# Altium schematic symbol library jlcpcb_2025_04_capacitors_extended_0805.schlib: 3281 symbols (part 16 of 18) (continued)
## JMK212BJ106MG-T (continued)
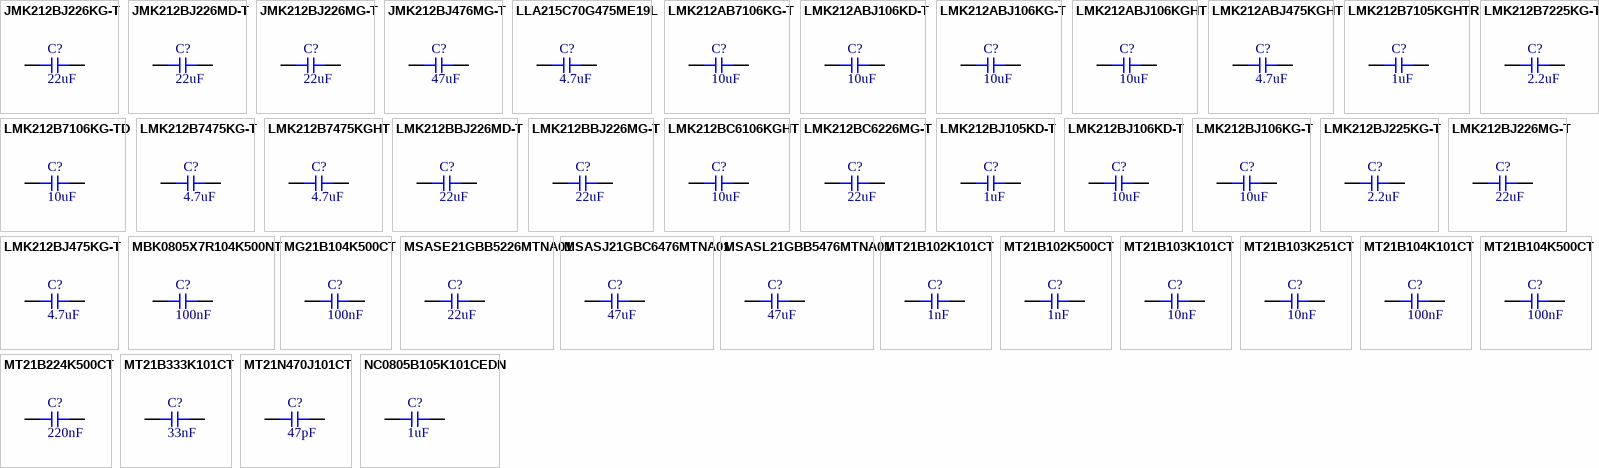
[diagram p71: symbols JMK212BJ226KG-T to NC0805B105K101CEDN]

## JMK212BJ226KG-T
designator C?  Capacitance: 22uF  (hidden comment: *)
Capacitor, Ceramic (MLCC), 22uF, ±10%, 6.3V, X5R, ±10%, SMD 0805; Manufacturer: Taiyo Yuden; Manufacturer Part Number: JMK212BJ226KG-T; Package Size: 0805; JLCPCB Basic Part: No; JLCPCB Part Number: C337450; Supplier 1: LCSC; Category: Capacitors - MLCC; Supplier Part Number 1: C337450; Tolerance: ±10%; Voltage Rating: 6.3V; Temperature Coefficient: X5R; RoHS: Yes; ComponentLink1Description: Datasheet; ComponentLink1URL: https://wmsc.lcsc.com/wmsc/upload/file/pdf/v2/lcsc/2211282230_Taiyo-Yuden-JMK212BJ226KG-T_C337450.pdf; ComponentLink2Description: JLCPCB Part URL; ComponentLink2URL: https://jlcpcb.com/partdetail/C337450; ComponentLink3Description: LCSC Part URL; ComponentLink3URL: https://lcsc.com/product-detail/Multilayer-Ceramic-Capacitors-MLCC---SMD-SMT_Taiyo-Yuden-Taiyo-Yuden-JMK212BJ226KG-T_C337450.html
footprint CAP-0805 (0805 (2012M) Capacitor)
pins: 1, 2

## JMK212BJ226MD-T
designator C?  Capacitance: 22uF  (hidden comment: *)
Capacitor, Ceramic (MLCC), 22uF, ±20%, 6.3V, X5R, ±20%, SMD 0805; Manufacturer: Taiyo Yuden; Manufacturer Part Number: JMK212BJ226MD-T; Package Size: 0805; JLCPCB Basic Part: No; JLCPCB Part Number: C111325; Supplier 1: LCSC; Category: Capacitors - MLCC; Supplier Part Number 1: C111325; Tolerance: ±20%; Voltage Rating: 6.3V; Temperature Coefficient: X5R; RoHS: Yes; ComponentLink1Description: Datasheet; ComponentLink1URL: https://wmsc.lcsc.com/wmsc/upload/file/pdf/v2/lcsc/2211282300_Taiyo-Yuden-JMK212BJ226MD-T_C111325.pdf; ComponentLink2Description: JLCPCB Part URL; ComponentLink2URL: https://jlcpcb.com/partdetail/C111325; ComponentLink3Description: LCSC Part URL; ComponentLink3URL: https://lcsc.com/product-detail/Multilayer-Ceramic-Capacitors-MLCC---SMD-SMT_Taiyo-Yuden-Taiyo-Yuden-JMK212BJ226MD-T_C111325.html
footprint CAP-0805 (0805 (2012M) Capacitor)
pins: 1, 2

## JMK212BJ226MG-T
designator C?  Capacitance: 22uF  (hidden comment: *)
Capacitor, Ceramic (MLCC), 22uF, ±20%, 6.3V, X5R, ±20%, SMD 0805; Manufacturer: Taiyo Yuden; Manufacturer Part Number: JMK212BJ226MG-T; Package Size: 0805; JLCPCB Basic Part: No; JLCPCB Part Number: C87158; Supplier 1: LCSC; Category: Capacitors - MLCC; Supplier Part Number 1: C87158; Tolerance: ±20%; Voltage Rating: 6.3V; Temperature Coefficient: X5R; RoHS: Yes; ComponentLink1Description: Datasheet; ComponentLink1URL: https://wmsc.lcsc.com/wmsc/upload/file/pdf/v2/lcsc/2304140030_Taiyo-Yuden-JMK212BJ226MG-T_C87158.pdf; ComponentLink2Description: JLCPCB Part URL; ComponentLink2URL: https://jlcpcb.com/partdetail/C87158; ComponentLink3Description: LCSC Part URL; ComponentLink3URL: https://lcsc.com/product-detail/Multilayer-Ceramic-Capacitors-MLCC---SMD-SMT_Taiyo-Yuden-Taiyo-Yuden-JMK212BJ226MG-T_C87158.html
footprint CAP-0805 (0805 (2012M) Capacitor)
pins: 1, 2

## JMK212BJ476MG-T
designator C?  Capacitance: 47uF  (hidden comment: *)
Capacitor, Ceramic (MLCC), 47uF, ±20%, 6.3V, X5R, ±20%, SMD 0805; Manufacturer: Taiyo Yuden; Manufacturer Part Number: JMK212BJ476MG-T; Package Size: 0805; JLCPCB Basic Part: No; JLCPCB Part Number: C87159; Supplier 1: LCSC; Category: Capacitors - MLCC; Supplier Part Number 1: C87159; Tolerance: ±20%; Voltage Rating: 6.3V; Temperature Coefficient: X5R; RoHS: Yes; ComponentLink1Description: Datasheet; ComponentLink1URL: https://wmsc.lcsc.com/wmsc/upload/file/pdf/v2/lcsc/2211282300_Taiyo-Yuden-JMK212BJ476MG-T_C87159.pdf; ComponentLink2Description: JLCPCB Part URL; ComponentLink2URL: https://jlcpcb.com/partdetail/C87159; ComponentLink3Description: LCSC Part URL; ComponentLink3URL: https://lcsc.com/product-detail/Multilayer-Ceramic-Capacitors-MLCC---SMD-SMT_Taiyo-Yuden-Taiyo-Yuden-JMK212BJ476MG-T_C87159.html
footprint CAP-0805 (0805 (2012M) Capacitor)
pins: 1, 2

## LLA215C70G475ME19L
designator C?  Capacitance: 4.7uF  (hidden comment: *)
Capacitor, Ceramic (MLCC), 4.7uF, ±20%, 4V, X7S, ±20%, SMD 0805; Manufacturer: Murata Electronics; Manufacturer Part Number: LLA215C70G475ME19L; Package Size: 0805; JLCPCB Basic Part: No; JLCPCB Part Number: C2293316; Supplier 1: LCSC; Category: Capacitors - MLCC; Supplier Part Number 1: C2293316; Tolerance: ±20%; Voltage Rating: 4V; Temperature Coefficient: X7S; RoHS: Yes; ComponentLink1Description: Datasheet; ComponentLink1URL: https://wmsc.lcsc.com/wmsc/upload/file/pdf/v2/lcsc/2308111644_Murata-Electronics-LLA215C70G475ME19L_C2293316.pdf; ComponentLink2Description: JLCPCB Part URL; ComponentLink2URL: https://jlcpcb.com/partdetail/C2293316; ComponentLink3Description: LCSC Part URL; ComponentLink3URL: https://lcsc.com/product-detail/Multilayer-Ceramic-Capacitors-MLCC---SMD-SMT_Murata-Electronics-Murata-Electronics-LLA215C70G475ME19L_C2293316.html
footprint CAP-0805 (0805 (2012M) Capacitor)
pins: 1, 2

## LMK212AB7106KG-T
designator C?  Capacitance: 10uF  (hidden comment: *)
Capacitor, Ceramic (MLCC), 10uF, ±10%, 10V, X7R, ±10%, SMD 0805; Manufacturer: Taiyo Yuden; Manufacturer Part Number: LMK212AB7106KG-T; Package Size: 0805; JLCPCB Basic Part: No; JLCPCB Part Number: C386056; Supplier 1: LCSC; Category: Capacitors - MLCC; Supplier Part Number 1: C386056; Tolerance: ±10%; Voltage Rating: 10V; Temperature Coefficient: X7R; RoHS: Yes; ComponentLink1Description: Datasheet; ComponentLink1URL: https://wmsc.lcsc.com/wmsc/upload/file/pdf/v2/lcsc/2304140030_Taiyo-Yuden-LMK212AB7106KG-T_C386056.pdf; ComponentLink2Description: JLCPCB Part URL; ComponentLink2URL: https://jlcpcb.com/partdetail/C386056; ComponentLink3Description: LCSC Part URL; ComponentLink3URL: https://lcsc.com/product-detail/Multilayer-Ceramic-Capacitors-MLCC---SMD-SMT_Taiyo-Yuden-Taiyo-Yuden-LMK212AB7106KG-T_C386056.html
footprint CAP-0805 (0805 (2012M) Capacitor)
pins: 1, 2

## LMK212ABJ106KD-T
designator C?  Capacitance: 10uF  (hidden comment: *)
Capacitor, Ceramic (MLCC), 10uF, ±10%, 10V, X5R, ±10%, SMD 0805; Manufacturer: Taiyo Yuden; Manufacturer Part Number: LMK212ABJ106KD-T; Package Size: 0805; JLCPCB Basic Part: No; JLCPCB Part Number: C2174247; Supplier 1: LCSC; Category: Capacitors - MLCC; Supplier Part Number 1: C2174247; Tolerance: ±10%; Voltage Rating: 10V; Temperature Coefficient: X5R; RoHS: Yes; ComponentLink1Description: Datasheet; ComponentLink1URL: https://wmsc.lcsc.com/wmsc/upload/file/pdf/v2/lcsc/2211282000_Taiyo-Yuden-LMK212ABJ106KD-T_C2174247.pdf; ComponentLink2Description: JLCPCB Part URL; ComponentLink2URL: https://jlcpcb.com/partdetail/C2174247; ComponentLink3Description: LCSC Part URL; ComponentLink3URL: https://lcsc.com/product-detail/Multilayer-Ceramic-Capacitors-MLCC---SMD-SMT_Taiyo-Yuden-Taiyo-Yuden-LMK212ABJ106KD-T_C2174247.html
footprint CAP-0805 (0805 (2012M) Capacitor)
pins: 1, 2

## LMK212ABJ106KG-T
designator C?  Capacitance: 10uF  (hidden comment: *)
Capacitor, Ceramic (MLCC), 10uF, ±10%, 10V, X5R, ±10%, SMD 0805; Manufacturer: Taiyo Yuden; Manufacturer Part Number: LMK212ABJ106KG-T; Package Size: 0805; JLCPCB Basic Part: No; JLCPCB Part Number: C187926; Supplier 1: LCSC; Category: Capacitors - MLCC; Supplier Part Number 1: C187926; Tolerance: ±10%; Voltage Rating: 10V; Temperature Coefficient: X5R; RoHS: Yes; ComponentLink1Description: Datasheet; ComponentLink1URL: https://wmsc.lcsc.com/wmsc/upload/file/pdf/v2/lcsc/2211282300_Taiyo-Yuden-LMK212ABJ106KG-T_C187926.pdf; ComponentLink2Description: JLCPCB Part URL; ComponentLink2URL: https://jlcpcb.com/partdetail/C187926; ComponentLink3Description: LCSC Part URL; ComponentLink3URL: https://lcsc.com/product-detail/Multilayer-Ceramic-Capacitors-MLCC---SMD-SMT_Taiyo-Yuden-Taiyo-Yuden-LMK212ABJ106KG-T_C187926.html
footprint CAP-0805 (0805 (2012M) Capacitor)
pins: 1, 2

## LMK212ABJ106KGHT
designator C?  Capacitance: 10uF  (hidden comment: *)
Capacitor, Ceramic (MLCC), 10uF, ±10%, 10V, X5R, ±10%, SMD 0805; Manufacturer: Taiyo Yuden; Manufacturer Part Number: LMK212ABJ106KGHT; Package Size: 0805; JLCPCB Basic Part: No; JLCPCB Part Number: C268025; Supplier 1: LCSC; Category: Capacitors - MLCC; Supplier Part Number 1: C268025; Tolerance: ±10%; Voltage Rating: 10V; Temperature Coefficient: X5R; RoHS: Yes; ComponentLink1Description: Datasheet; ComponentLink1URL: https://wmsc.lcsc.com/wmsc/upload/file/pdf/v2/lcsc/2211282230_Taiyo-Yuden-LMK212ABJ106KGHT_C268025.pdf; ComponentLink2Description: JLCPCB Part URL; ComponentLink2URL: https://jlcpcb.com/partdetail/C268025; ComponentLink3Description: LCSC Part URL; ComponentLink3URL: https://lcsc.com/product-detail/Multilayer-Ceramic-Capacitors-MLCC---SMD-SMT_Taiyo-Yuden-Taiyo-Yuden-LMK212ABJ106KGHT_C268025.html
footprint CAP-0805 (0805 (2012M) Capacitor)
pins: 1, 2

## LMK212ABJ475KGHT
designator C?  Capacitance: 4.7uF  (hidden comment: *)
Capacitor, Ceramic (MLCC), 4.7uF, ±10%, 10V, X5R, ±10%, SMD 0805; Manufacturer: Taiyo Yuden; Manufacturer Part Number: LMK212ABJ475KGHT; Package Size: 0805; JLCPCB Basic Part: No; JLCPCB Part Number: C651024; Supplier 1: LCSC; Category: Capacitors - MLCC; Supplier Part Number 1: C651024; Tolerance: ±10%; Voltage Rating: 10V; Temperature Coefficient: X5R; RoHS: Yes; ComponentLink1Description: Datasheet; ComponentLink1URL: https://wmsc.lcsc.com/wmsc/upload/file/pdf/v2/lcsc/2211282200_Taiyo-Yuden-LMK212ABJ475KGHT_C651024.pdf; ComponentLink2Description: JLCPCB Part URL; ComponentLink2URL: https://jlcpcb.com/partdetail/C651024; ComponentLink3Description: LCSC Part URL; ComponentLink3URL: https://lcsc.com/product-detail/Multilayer-Ceramic-Capacitors-MLCC---SMD-SMT_Taiyo-Yuden-Taiyo-Yuden-LMK212ABJ475KGHT_C651024.html
footprint CAP-0805 (0805 (2012M) Capacitor)
pins: 1, 2

## LMK212B7105KGHTR
designator C?  Capacitance: 1uF  (hidden comment: *)
Capacitor, Ceramic (MLCC), 1uF, ±10%, 10V, X7R, ±10%, SMD 0805; Manufacturer: Taiyo Yuden; Manufacturer Part Number: LMK212B7105KGHTR; Package Size: 0805; JLCPCB Basic Part: No; JLCPCB Part Number: C650988; Supplier 1: LCSC; Category: Capacitors - MLCC; Supplier Part Number 1: C650988; Tolerance: ±10%; Voltage Rating: 10V; Temperature Coefficient: X7R; RoHS: Yes; ComponentLink1Description: Datasheet; ComponentLink1URL: https://wmsc.lcsc.com/wmsc/upload/file/pdf/v2/lcsc/2211282200_Taiyo-Yuden-LMK212B7105KGHTR_C650988.pdf; ComponentLink2Description: JLCPCB Part URL; ComponentLink2URL: https://jlcpcb.com/partdetail/C650988; ComponentLink3Description: LCSC Part URL; ComponentLink3URL: https://lcsc.com/product-detail/Multilayer-Ceramic-Capacitors-MLCC---SMD-SMT_Taiyo-Yuden-Taiyo-Yuden-LMK212B7105KGHTR_C650988.html
footprint CAP-0805 (0805 (2012M) Capacitor)
pins: 1, 2

## LMK212B7106KG-TD
designator C?  Capacitance: 10uF  (hidden comment: *)
Capacitor, Ceramic (MLCC), 10uF, ±10%, 10V, X7R, ±10%, SMD 0805; Manufacturer: Taiyo Yuden; Manufacturer Part Number: LMK212B7106KG-TD; Package Size: 0805; JLCPCB Basic Part: No; JLCPCB Part Number: C3837096; Supplier 1: LCSC; Category: Capacitors - MLCC; Supplier Part Number 1: C3837096; Tolerance: ±10%; Voltage Rating: 10V; Temperature Coefficient: X7R; RoHS: Yes; ComponentLink1Description: Datasheet; ComponentLink1URL: https://wmsc.lcsc.com/wmsc/upload/file/pdf/v2/lcsc/2211281730_Taiyo-Yuden-LMK212B7106KG-TD_C3837096.pdf; ComponentLink2Description: JLCPCB Part URL; ComponentLink2URL: https://jlcpcb.com/partdetail/C3837096; ComponentLink3Description: LCSC Part URL; ComponentLink3URL: https://lcsc.com/product-detail/Multilayer-Ceramic-Capacitors-MLCC---SMD-SMT_Taiyo-Yuden-Taiyo-Yuden-LMK212B7106KG-TD_C3837096.html
footprint CAP-0805 (0805 (2012M) Capacitor)
pins: 1, 2

## LMK212B7225KG-T
designator C?  Capacitance: 2.2uF  (hidden comment: *)
Capacitor, Ceramic (MLCC), 2.2uF, ±10%, 10V, X7R, ±10%, SMD 0805; Manufacturer: Taiyo Yuden; Manufacturer Part Number: LMK212B7225KG-T; Package Size: 0805; JLCPCB Basic Part: No; JLCPCB Part Number: C92809; Supplier 1: LCSC; Category: Capacitors - MLCC; Supplier Part Number 1: C92809; Tolerance: ±10%; Voltage Rating: 10V; Temperature Coefficient: X7R; RoHS: Yes; ComponentLink1Description: Datasheet; ComponentLink1URL: https://wmsc.lcsc.com/wmsc/upload/file/pdf/v2/lcsc/2211282300_Taiyo-Yuden-LMK212B7225KG-T_C92809.pdf; ComponentLink2Description: JLCPCB Part URL; ComponentLink2URL: https://jlcpcb.com/partdetail/C92809; ComponentLink3Description: LCSC Part URL; ComponentLink3URL: https://lcsc.com/product-detail/Multilayer-Ceramic-Capacitors-MLCC---SMD-SMT_Taiyo-Yuden-Taiyo-Yuden-LMK212B7225KG-T_C92809.html
footprint CAP-0805 (0805 (2012M) Capacitor)
pins: 1, 2

## LMK212B7475KG-T
designator C?  Capacitance: 4.7uF  (hidden comment: *)
Capacitor, Ceramic (MLCC), 4.7uF, ±10%, 10V, X7R, ±10%, SMD 0805; Manufacturer: Taiyo Yuden; Manufacturer Part Number: LMK212B7475KG-T; Package Size: 0805; JLCPCB Basic Part: No; JLCPCB Part Number: C92810; Supplier 1: LCSC; Category: Capacitors - MLCC; Supplier Part Number 1: C92810; Tolerance: ±10%; Voltage Rating: 10V; Temperature Coefficient: X7R; RoHS: Yes; ComponentLink1Description: Datasheet; ComponentLink1URL: https://wmsc.lcsc.com/wmsc/upload/file/pdf/v2/lcsc/2211282300_Taiyo-Yuden-LMK212B7475KG-T_C92810.pdf; ComponentLink2Description: JLCPCB Part URL; ComponentLink2URL: https://jlcpcb.com/partdetail/C92810; ComponentLink3Description: LCSC Part URL; ComponentLink3URL: https://lcsc.com/product-detail/Multilayer-Ceramic-Capacitors-MLCC---SMD-SMT_Taiyo-Yuden-Taiyo-Yuden-LMK212B7475KG-T_C92810.html
footprint CAP-0805 (0805 (2012M) Capacitor)
pins: 1, 2

## LMK212B7475KGHT
designator C?  Capacitance: 4.7uF  (hidden comment: *)
Capacitor, Ceramic (MLCC), 4.7uF, ±10%, 10V, X7R, ±10%, SMD 0805; Manufacturer: Taiyo Yuden; Manufacturer Part Number: LMK212B7475KGHT; Package Size: 0805; JLCPCB Basic Part: No; JLCPCB Part Number: C386057; Supplier 1: LCSC; Category: Capacitors - MLCC; Supplier Part Number 1: C386057; Tolerance: ±10%; Voltage Rating: 10V; Temperature Coefficient: X7R; RoHS: Yes; ComponentLink1Description: Datasheet; ComponentLink1URL: https://wmsc.lcsc.com/wmsc/upload/file/pdf/v2/lcsc/2211282230_Taiyo-Yuden-LMK212B7475KGHT_C386057.pdf; ComponentLink2Description: JLCPCB Part URL; ComponentLink2URL: https://jlcpcb.com/partdetail/C386057; ComponentLink3Description: LCSC Part URL; ComponentLink3URL: https://lcsc.com/product-detail/Multilayer-Ceramic-Capacitors-MLCC---SMD-SMT_Taiyo-Yuden-Taiyo-Yuden-LMK212B7475KGHT_C386057.html
footprint CAP-0805 (0805 (2012M) Capacitor)
pins: 1, 2

## LMK212BBJ226MD-T
designator C?  Capacitance: 22uF  (hidden comment: *)
Capacitor, Ceramic (MLCC), 22uF, ±20%, 10V, X5R, ±20%, SMD 0805; Manufacturer: Taiyo Yuden; Manufacturer Part Number: LMK212BBJ226MD-T; Package Size: 0805; JLCPCB Basic Part: No; JLCPCB Part Number: C2177954; Supplier 1: LCSC; Category: Capacitors - MLCC; Supplier Part Number 1: C2177954; Tolerance: ±20%; Voltage Rating: 10V; Temperature Coefficient: X5R; RoHS: Yes; ComponentLink1Description: Datasheet; ComponentLink1URL: https://wmsc.lcsc.com/wmsc/upload/file/pdf/v2/lcsc/2309051414_Taiyo-Yuden-LMK212BBJ226MD-T_C2177954.pdf; ComponentLink2Description: JLCPCB Part URL; ComponentLink2URL: https://jlcpcb.com/partdetail/C2177954; ComponentLink3Description: LCSC Part URL; ComponentLink3URL: https://lcsc.com/product-detail/Multilayer-Ceramic-Capacitors-MLCC---SMD-SMT_Taiyo-Yuden-Taiyo-Yuden-LMK212BBJ226MD-T_C2177954.html
footprint CAP-0805 (0805 (2012M) Capacitor)
pins: 1, 2

## LMK212BBJ226MG-T
designator C?  Capacitance: 22uF  (hidden comment: *)
Capacitor, Ceramic (MLCC), 22uF, ±20%, 10V, X5R, ±20%, SMD 0805; Manufacturer: Taiyo Yuden; Manufacturer Part Number: LMK212BBJ226MG-T; Package Size: 0805; JLCPCB Basic Part: No; JLCPCB Part Number: C92811; Supplier 1: LCSC; Category: Capacitors - MLCC; Supplier Part Number 1: C92811; Tolerance: ±20%; Voltage Rating: 10V; Temperature Coefficient: X5R; RoHS: Yes; ComponentLink1Description: Datasheet; ComponentLink1URL: https://wmsc.lcsc.com/wmsc/upload/file/pdf/v2/lcsc/1810171733_Taiyo-Yuden-LMK212BBJ226MG-T_C92811.pdf; ComponentLink2Description: JLCPCB Part URL; ComponentLink2URL: https://jlcpcb.com/partdetail/C92811; ComponentLink3Description: LCSC Part URL; ComponentLink3URL: https://lcsc.com/product-detail/Multilayer-Ceramic-Capacitors-MLCC---SMD-SMT_Taiyo-Yuden-Taiyo-Yuden-LMK212BBJ226MG-T_C92811.html
footprint CAP-0805 (0805 (2012M) Capacitor)
pins: 1, 2

## LMK212BC6106KGHT
designator C?  Capacitance: 10uF  (hidden comment: *)
Capacitor, Ceramic (MLCC), 10uF, ±10%, 10V, X6S, ±10%, SMD 0805; Manufacturer: Taiyo Yuden; Manufacturer Part Number: LMK212BC6106KGHT; Package Size: 0805; JLCPCB Basic Part: No; JLCPCB Part Number: C412455; Supplier 1: LCSC; Category: Capacitors - MLCC; Supplier Part Number 1: C412455; Tolerance: ±10%; Voltage Rating: 10V; Temperature Coefficient: X6S; RoHS: Yes; ComponentLink1Description: Datasheet; ComponentLink1URL: https://wmsc.lcsc.com/wmsc/upload/file/pdf/v2/lcsc/2304140030_Taiyo-Yuden-LMK212BC6106KGHT_C412455.pdf; ComponentLink2Description: JLCPCB Part URL; ComponentLink2URL: https://jlcpcb.com/partdetail/C412455; ComponentLink3Description: LCSC Part URL; ComponentLink3URL: https://lcsc.com/product-detail/Multilayer-Ceramic-Capacitors-MLCC---SMD-SMT_Taiyo-Yuden-Taiyo-Yuden-LMK212BC6106KGHT_C412455.html
footprint CAP-0805 (0805 (2012M) Capacitor)
pins: 1, 2

## LMK212BC6226MG-T
designator C?  Capacitance: 22uF  (hidden comment: *)
Capacitor, Ceramic (MLCC), 22uF, ±20%, 10V, X6S, ±20%, SMD 0805; Manufacturer: Taiyo Yuden; Manufacturer Part Number: LMK212BC6226MG-T; Package Size: 0805; JLCPCB Basic Part: No; JLCPCB Part Number: C651028; Supplier 1: LCSC; Category: Capacitors - MLCC; Supplier Part Number 1: C651028; Tolerance: ±20%; Voltage Rating: 10V; Temperature Coefficient: X6S; RoHS: Yes; ComponentLink1Description: Datasheet; ComponentLink1URL: https://wmsc.lcsc.com/wmsc/upload/file/pdf/v2/lcsc/2202140030_Taiyo-Yuden-LMK212BC6226MG-T_C651028.pdf; ComponentLink2Description: JLCPCB Part URL; ComponentLink2URL: https://jlcpcb.com/partdetail/C651028; ComponentLink3Description: LCSC Part URL; ComponentLink3URL: https://lcsc.com/product-detail/Multilayer-Ceramic-Capacitors-MLCC---SMD-SMT_Taiyo-Yuden-Taiyo-Yuden-LMK212BC6226MG-T_C651028.html
footprint CAP-0805 (0805 (2012M) Capacitor)
pins: 1, 2

## LMK212BJ105KD-T
designator C?  Capacitance: 1uF  (hidden comment: *)
Capacitor, Ceramic (MLCC), 1uF, ±10%, 10V, X5R, ±10%, SMD 0805; Manufacturer: Taiyo Yuden; Manufacturer Part Number: LMK212BJ105KD-T; Package Size: 0805; JLCPCB Basic Part: No; JLCPCB Part Number: C92812; Supplier 1: LCSC; Category: Capacitors - MLCC; Supplier Part Number 1: C92812; Tolerance: ±10%; Voltage Rating: 10V; Temperature Coefficient: X5R; RoHS: Yes; ComponentLink1Description: Datasheet; ComponentLink1URL: https://wmsc.lcsc.com/wmsc/upload/file/pdf/v2/lcsc/2211282300_Taiyo-Yuden-LMK212BJ105KD-T_C92812.pdf; ComponentLink2Description: JLCPCB Part URL; ComponentLink2URL: https://jlcpcb.com/partdetail/C92812; ComponentLink3Description: LCSC Part URL; ComponentLink3URL: https://lcsc.com/product-detail/Multilayer-Ceramic-Capacitors-MLCC---SMD-SMT_Taiyo-Yuden-Taiyo-Yuden-LMK212BJ105KD-T_C92812.html
footprint CAP-0805 (0805 (2012M) Capacitor)
pins: 1, 2

## LMK212BJ106KD-T
designator C?  Capacitance: 10uF  (hidden comment: *)
Capacitor, Ceramic (MLCC), 10uF, ±10%, 10V, X5R, ±10%, SMD 0805; Manufacturer: Taiyo Yuden; Manufacturer Part Number: LMK212BJ106KD-T; Package Size: 0805; JLCPCB Basic Part: No; JLCPCB Part Number: C89143; Supplier 1: LCSC; Category: Capacitors - MLCC; Supplier Part Number 1: C89143; Tolerance: ±10%; Voltage Rating: 10V; Temperature Coefficient: X5R; RoHS: Yes; ComponentLink1Description: Datasheet; ComponentLink1URL: https://wmsc.lcsc.com/wmsc/upload/file/pdf/v2/lcsc/2211282300_Taiyo-Yuden-LMK212BJ106KD-T_C89143.pdf; ComponentLink2Description: JLCPCB Part URL; ComponentLink2URL: https://jlcpcb.com/partdetail/C89143; ComponentLink3Description: LCSC Part URL; ComponentLink3URL: https://lcsc.com/product-detail/Multilayer-Ceramic-Capacitors-MLCC---SMD-SMT_Taiyo-Yuden-Taiyo-Yuden-LMK212BJ106KD-T_C89143.html
footprint CAP-0805 (0805 (2012M) Capacitor)
pins: 1, 2

## LMK212BJ106KG-T
designator C?  Capacitance: 10uF  (hidden comment: *)
Capacitor, Ceramic (MLCC), 10uF, ±10%, 10V, X5R, ±10%, SMD 0805; Manufacturer: Taiyo Yuden; Manufacturer Part Number: LMK212BJ106KG-T; Package Size: 0805; JLCPCB Basic Part: No; JLCPCB Part Number: C87156; Supplier 1: LCSC; Category: Capacitors - MLCC; Supplier Part Number 1: C87156; Tolerance: ±10%; Voltage Rating: 10V; Temperature Coefficient: X5R; RoHS: Yes; ComponentLink1Description: Datasheet; ComponentLink1URL: https://wmsc.lcsc.com/wmsc/upload/file/pdf/v2/lcsc/2211282300_Taiyo-Yuden-LMK212BJ106KG-T_C87156.pdf; ComponentLink2Description: JLCPCB Part URL; ComponentLink2URL: https://jlcpcb.com/partdetail/C87156; ComponentLink3Description: LCSC Part URL; ComponentLink3URL: https://lcsc.com/product-detail/Multilayer-Ceramic-Capacitors-MLCC---SMD-SMT_Taiyo-Yuden-Taiyo-Yuden-LMK212BJ106KG-T_C87156.html
footprint CAP-0805 (0805 (2012M) Capacitor)
pins: 1, 2

## LMK212BJ225KG-T
designator C?  Capacitance: 2.2uF  (hidden comment: *)
Capacitor, Ceramic (MLCC), 2.2uF, ±10%, 10V, X5R, ±10%, SMD 0805; Manufacturer: Taiyo Yuden; Manufacturer Part Number: LMK212BJ225KG-T; Package Size: 0805; JLCPCB Basic Part: No; JLCPCB Part Number: C386060; Supplier 1: LCSC; Category: Capacitors - MLCC; Supplier Part Number 1: C386060; Tolerance: ±10%; Voltage Rating: 10V; Temperature Coefficient: X5R; RoHS: Yes; ComponentLink1Description: Datasheet; ComponentLink1URL: https://wmsc.lcsc.com/wmsc/upload/file/pdf/v2/lcsc/2211282230_Taiyo-Yuden-LMK212BJ225KG-T_C386060.pdf; ComponentLink2Description: JLCPCB Part URL; ComponentLink2URL: https://jlcpcb.com/partdetail/C386060; ComponentLink3Description: LCSC Part URL; ComponentLink3URL: https://lcsc.com/product-detail/Multilayer-Ceramic-Capacitors-MLCC---SMD-SMT_Taiyo-Yuden-Taiyo-Yuden-LMK212BJ225KG-T_C386060.html
footprint CAP-0805 (0805 (2012M) Capacitor)
pins: 1, 2

## LMK212BJ226MG-T
designator C?  Capacitance: 22uF  (hidden comment: *)
Capacitor, Ceramic (MLCC), 22uF, ±20%, 10V, X5R, ±20%, SMD 0805; Manufacturer: Taiyo Yuden; Manufacturer Part Number: LMK212BJ226MG-T; Package Size: 0805; JLCPCB Basic Part: No; JLCPCB Part Number: C92814; Supplier 1: LCSC; Category: Capacitors - MLCC; Supplier Part Number 1: C92814; Tolerance: ±20%; Voltage Rating: 10V; Temperature Coefficient: X5R; RoHS: Yes; ComponentLink1Description: Datasheet; ComponentLink1URL: https://wmsc.lcsc.com/wmsc/upload/file/pdf/v2/lcsc/2211282300_Taiyo-Yuden-LMK212BJ226MG-T_C92814.pdf; ComponentLink2Description: JLCPCB Part URL; ComponentLink2URL: https://jlcpcb.com/partdetail/C92814; ComponentLink3Description: LCSC Part URL; ComponentLink3URL: https://lcsc.com/product-detail/Multilayer-Ceramic-Capacitors-MLCC---SMD-SMT_Taiyo-Yuden-Taiyo-Yuden-LMK212BJ226MG-T_C92814.html
footprint CAP-0805 (0805 (2012M) Capacitor)
pins: 1, 2

## LMK212BJ475KG-T
designator C?  Capacitance: 4.7uF  (hidden comment: *)
Capacitor, Ceramic (MLCC), 4.7uF, ±10%, 10V, X5R, ±10%, SMD 0805; Manufacturer: Taiyo Yuden; Manufacturer Part Number: LMK212BJ475KG-T; Package Size: 0805; JLCPCB Basic Part: No; JLCPCB Part Number: C92816; Supplier 1: LCSC; Category: Capacitors - MLCC; Supplier Part Number 1: C92816; Tolerance: ±10%; Voltage Rating: 10V; Temperature Coefficient: X5R; RoHS: Yes; ComponentLink1Description: Datasheet; ComponentLink1URL: https://wmsc.lcsc.com/wmsc/upload/file/pdf/v2/lcsc/2211282300_Taiyo-Yuden-LMK212BJ475KG-T_C92816.pdf; ComponentLink2Description: JLCPCB Part URL; ComponentLink2URL: https://jlcpcb.com/partdetail/C92816; ComponentLink3Description: LCSC Part URL; ComponentLink3URL: https://lcsc.com/product-detail/Multilayer-Ceramic-Capacitors-MLCC---SMD-SMT_Taiyo-Yuden-Taiyo-Yuden-LMK212BJ475KG-T_C92816.html
footprint CAP-0805 (0805 (2012M) Capacitor)
pins: 1, 2

## MBK0805X7R104K500NT
designator C?  Capacitance: 100nF  (hidden comment: *)
Capacitor, Ceramic (MLCC), 100nF, 50V, SMD 0805; Manufacturer: FH-BK(Guangdong Fenghua Bangke Elec); Manufacturer Part Number: MBK0805X7R104K500NT; Package Size: 0805; JLCPCB Basic Part: No; JLCPCB Part Number: C2830721; Supplier 1: LCSC; Category: Capacitors - MLCC; Supplier Part Number 1: C2830721; Voltage Rating: 50V; RoHS: Yes; ComponentLink1Description: Datasheet; ComponentLink1URL: https://wmsc.lcsc.com/wmsc/upload/file/pdf/v2/lcsc/2105241611_FH-BK-Guangdong-Fenghua-Bangke-Elec-MBK0805X7R104K500NT_C2830721.pdf; ComponentLink2Description: JLCPCB Part URL; ComponentLink2URL: https://jlcpcb.com/partdetail/C2830721; ComponentLink3Description: LCSC Part URL; ComponentLink3URL: https://lcsc.com/product-detail/Multilayer-Ceramic-Capacitors-MLCC---SMD-SMT_FH-BKGuangdong-Fenghua-Bangke-Elec-FH-BKGuangdong-Fenghua-Bangke-Elec-0805B104K500NT_C2830721.html
footprint CAP-0805 (0805 (2012M) Capacitor)
pins: 1, 2

## MG21B104K500CT
designator C?  Capacitance: 100nF  (hidden comment: *)
Capacitor, Ceramic (MLCC), 100nF, ±10%, 50V, X7R, ±10%, SMD 0805; Manufacturer: Walsin Tech Corp; Manufacturer Part Number: MG21B104K500CT; Package Size: 0805; JLCPCB Basic Part: No; JLCPCB Part Number: C327793; Supplier 1: LCSC; Category: Capacitors - MLCC; Supplier Part Number 1: C327793; Tolerance: ±10%; Voltage Rating: 50V; Temperature Coefficient: X7R; RoHS: Yes; ComponentLink1Description: Datasheet; ComponentLink1URL: https://wmsc.lcsc.com/wmsc/upload/file/pdf/v2/lcsc/1811131740_Walsin-Tech-Corp-MG21B104K500CT_C327793.pdf; ComponentLink2Description: JLCPCB Part URL; ComponentLink2URL: https://jlcpcb.com/partdetail/C327793; ComponentLink3Description: LCSC Part URL; ComponentLink3URL: https://lcsc.com/product-detail/Multilayer-Ceramic-Capacitors-MLCC---SMD-SMT_Walsin-Tech-Corp-Walsin-Tech-Corp-MG21B104K500CT_C327793.html
footprint CAP-0805 (0805 (2012M) Capacitor)
pins: 1, 2

## MSASE21GBB5226MTNA01
designator C?  Capacitance: 22uF  (hidden comment: *)
Capacitor, Ceramic (MLCC), 22uF, ±20%, 16V, X5R, ±20%, SMD 0805; Manufacturer: Taiyo Yuden; Manufacturer Part Number: MSASE21GBB5226MTNA01; Package Size: 0805; JLCPCB Basic Part: No; JLCPCB Part Number: C140602; Supplier 1: LCSC; Category: Capacitors - MLCC; Supplier Part Number 1: C140602; Tolerance: ±20%; Voltage Rating: 16V; Temperature Coefficient: X5R; RoHS: Yes; ComponentLink1Description: Datasheet; ComponentLink1URL: https://wmsc.lcsc.com/wmsc/upload/file/pdf/v2/lcsc/2308281043_Taiyo-Yuden-MSASE21GBB5226MTNA01_C140602.pdf; ComponentLink2Description: JLCPCB Part URL; ComponentLink2URL: https://jlcpcb.com/partdetail/C140602; ComponentLink3Description: LCSC Part URL; ComponentLink3URL: https://lcsc.com/product-detail/Multilayer-Ceramic-Capacitors-MLCC---SMD-SMT_Taiyo-Yuden-Taiyo-Yuden-EMK212BBJ226MG-T_C140602.html
footprint CAP-0805 (0805 (2012M) Capacitor)
pins: 1, 2

## MSASJ21GBC6476MTNA01
designator C?  Capacitance: 47uF  (hidden comment: *)
Capacitor, Ceramic (MLCC), 47uF, ±20%, 6.3V, X6S, ±20%, SMD 0805; Manufacturer: Taiyo Yuden; Manufacturer Part Number: MSASJ21GBC6476MTNA01; Package Size: 0805; JLCPCB Basic Part: No; JLCPCB Part Number: C697611; Supplier 1: LCSC; Category: Capacitors - MLCC; Supplier Part Number 1: C697611; Tolerance: ±20%; Voltage Rating: 6.3V; Temperature Coefficient: X6S; RoHS: Yes; ComponentLink1Description: Datasheet; ComponentLink1URL: https://wmsc.lcsc.com/wmsc/upload/file/pdf/v2/lcsc/2008241907_Taiyo-Yuden-MSASJ21GBC6476MTNA01_C697611.pdf; ComponentLink2Description: JLCPCB Part URL; ComponentLink2URL: https://jlcpcb.com/partdetail/C697611; ComponentLink3Description: LCSC Part URL; ComponentLink3URL: https://lcsc.com/product-detail/Multilayer-Ceramic-Capacitors-MLCC---SMD-SMT_Taiyo-Yuden-Taiyo-Yuden-JMK212BC6476MG-T_C697611.html
footprint CAP-0805 (0805 (2012M) Capacitor)
pins: 1, 2

## MSASL21GBB5476MTNA01
designator C?  Capacitance: 47uF  (hidden comment: *)
Capacitor, Ceramic (MLCC), 47uF, ±20%, 10V, X5R, ±20%, SMD 0805; Manufacturer: Taiyo Yuden; Manufacturer Part Number: MSASL21GBB5476MTNA01; Package Size: 0805; JLCPCB Basic Part: No; JLCPCB Part Number: C386058; Supplier 1: LCSC; Category: Capacitors - MLCC; Supplier Part Number 1: C386058; Tolerance: ±20%; Voltage Rating: 10V; Temperature Coefficient: X5R; RoHS: Yes; ComponentLink1Description: Datasheet; ComponentLink1URL: https://wmsc.lcsc.com/wmsc/upload/file/pdf/v2/lcsc/2404011009_Taiyo-Yuden-MSASL21GBB5476MTNA01_C386058.pdf; ComponentLink2Description: JLCPCB Part URL; ComponentLink2URL: https://jlcpcb.com/partdetail/C386058; ComponentLink3Description: LCSC Part URL; ComponentLink3URL: https://lcsc.com/product-detail/Multilayer-Ceramic-Capacitors-MLCC---SMD-SMT_Taiyo-Yuden-Taiyo-Yuden-LMK212BBJ476MG-T_C386058.html
footprint CAP-0805 (0805 (2012M) Capacitor)
pins: 1, 2

## MT21B102K101CT
designator C?  Capacitance: 1nF  (hidden comment: *)
Capacitor, Ceramic (MLCC), 1nF, ±10%, 100V, X7R, ±10%, SMD 0805; Manufacturer: Walsin Tech Corp; Manufacturer Part Number: MT21B102K101CT; Package Size: 0805; JLCPCB Basic Part: No; JLCPCB Part Number: C323558; Supplier 1: LCSC; Category: Capacitors - MLCC; Supplier Part Number 1: C323558; Tolerance: ±10%; Voltage Rating: 100V; Temperature Coefficient: X7R; RoHS: Yes; ComponentLink1Description: Datasheet; ComponentLink1URL: https://wmsc.lcsc.com/wmsc/upload/file/pdf/v2/lcsc/2304140030_Walsin-Tech-Corp-MT21B102K101CT_C323558.pdf; ComponentLink2Description: JLCPCB Part URL; ComponentLink2URL: https://jlcpcb.com/partdetail/C323558; ComponentLink3Description: LCSC Part URL; ComponentLink3URL: https://lcsc.com/product-detail/Multilayer-Ceramic-Capacitors-MLCC---SMD-SMT_Walsin-Tech-Corp-Walsin-Tech-Corp-MT21B102K101CT_C323558.html
footprint CAP-0805 (0805 (2012M) Capacitor)
pins: 1, 2

## MT21B102K500CT
designator C?  Capacitance: 1nF  (hidden comment: *)
Capacitor, Ceramic (MLCC), 1nF, ±10%, 50V, X7R, ±10%, SMD 0805; Manufacturer: Walsin Tech Corp; Manufacturer Part Number: MT21B102K500CT; Package Size: 0805; JLCPCB Basic Part: No; JLCPCB Part Number: C366883; Supplier 1: LCSC; Category: Capacitors - MLCC; Supplier Part Number 1: C366883; Tolerance: ±10%; Voltage Rating: 50V; Temperature Coefficient: X7R; RoHS: Yes; ComponentLink1Description: Datasheet; ComponentLink1URL: https://wmsc.lcsc.com/wmsc/upload/file/pdf/v2/lcsc/2304140030_Walsin-Tech-Corp-MT21B102K500CT_C366883.pdf; ComponentLink2Description: JLCPCB Part URL; ComponentLink2URL: https://jlcpcb.com/partdetail/C366883; ComponentLink3Description: LCSC Part URL; ComponentLink3URL: https://lcsc.com/product-detail/Multilayer-Ceramic-Capacitors-MLCC---SMD-SMT_Walsin-Tech-Corp-Walsin-Tech-Corp-MT21B102K500CT_C366883.html
footprint CAP-0805 (0805 (2012M) Capacitor)
pins: 1, 2

## MT21B103K101CT
designator C?  Capacitance: 10nF  (hidden comment: *)
Capacitor, Ceramic (MLCC), 10nF, ±10%, 100V, X7R, ±10%, SMD 0805; Manufacturer: Walsin Tech Corp; Manufacturer Part Number: MT21B103K101CT; Package Size: 0805; JLCPCB Basic Part: No; JLCPCB Part Number: C2918572; Supplier 1: LCSC; Category: Capacitors - MLCC; Supplier Part Number 1: C2918572; Tolerance: ±10%; Voltage Rating: 100V; Temperature Coefficient: X7R; RoHS: Yes; ComponentLink1Description: Datasheet; ComponentLink1URL: https://wmsc.lcsc.com/wmsc/upload/file/pdf/v2/lcsc/2111171830_Walsin-Tech-Corp-MT21B103K101CT_C2918572.pdf; ComponentLink2Description: JLCPCB Part URL; ComponentLink2URL: https://jlcpcb.com/partdetail/C2918572; ComponentLink3Description: LCSC Part URL; ComponentLink3URL: https://lcsc.com/product-detail/Multilayer-Ceramic-Capacitors-MLCC---SMD-SMT_Walsin-Tech-Corp-Walsin-Tech-Corp-MT21B103K101CT_C2918572.html
footprint CAP-0805 (0805 (2012M) Capacitor)
pins: 1, 2

## MT21B103K251CT
designator C?  Capacitance: 10nF  (hidden comment: *)
Capacitor, Ceramic (MLCC), 10nF, ±10%, 250V, X7R, ±10%, SMD 0805; Manufacturer: Walsin Tech Corp; Manufacturer Part Number: MT21B103K251CT; Package Size: 0805; JLCPCB Basic Part: No; JLCPCB Part Number: C470044; Supplier 1: LCSC; Category: Capacitors - MLCC; Supplier Part Number 1: C470044; Tolerance: ±10%; Voltage Rating: 250V; Temperature Coefficient: X7R; RoHS: Yes; ComponentLink1Description: Datasheet; ComponentLink1URL: https://wmsc.lcsc.com/wmsc/upload/file/pdf/v2/lcsc/2304140030_Walsin-Tech-Corp-MT21B103K251CT_C470044.pdf; ComponentLink2Description: JLCPCB Part URL; ComponentLink2URL: https://jlcpcb.com/partdetail/C470044; ComponentLink3Description: LCSC Part URL; ComponentLink3URL: https://lcsc.com/product-detail/Multilayer-Ceramic-Capacitors-MLCC---SMD-SMT_Walsin-Tech-Corp-Walsin-Tech-Corp-MT21B103K251CT_C470044.html
footprint CAP-0805 (0805 (2012M) Capacitor)
pins: 1, 2

## MT21B104K101CT
designator C?  Capacitance: 100nF  (hidden comment: *)
Capacitor, Ceramic (MLCC), 100nF, ±10%, 100V, X7R, ±10%, SMD 0805; Manufacturer: Walsin Tech Corp; Manufacturer Part Number: MT21B104K101CT; Package Size: 0805; JLCPCB Basic Part: No; JLCPCB Part Number: C2918563; Supplier 1: LCSC; Category: Capacitors - MLCC; Supplier Part Number 1: C2918563; Tolerance: ±10%; Voltage Rating: 100V; Temperature Coefficient: X7R; RoHS: Yes; ComponentLink1Description: Datasheet; ComponentLink1URL: https://wmsc.lcsc.com/wmsc/upload/file/pdf/v2/lcsc/2111171830_Walsin-Tech-Corp-MT21B104K101CT_C2918563.pdf; ComponentLink2Description: JLCPCB Part URL; ComponentLink2URL: https://jlcpcb.com/partdetail/C2918563; ComponentLink3Description: LCSC Part URL; ComponentLink3URL: https://lcsc.com/product-detail/Multilayer-Ceramic-Capacitors-MLCC---SMD-SMT_Walsin-Tech-Corp-Walsin-Tech-Corp-MT21B104K101CT_C2918563.html
footprint CAP-0805 (0805 (2012M) Capacitor)
pins: 1, 2

## MT21B104K500CT
designator C?  Capacitance: 100nF  (hidden comment: *)
Capacitor, Ceramic (MLCC), 100nF, ±10%, 50V, X7R, ±10%, SMD 0805; Manufacturer: Walsin Tech Corp; Manufacturer Part Number: MT21B104K500CT; Package Size: 0805; JLCPCB Basic Part: No; JLCPCB Part Number: C338159; Supplier 1: LCSC; Category: Capacitors - MLCC; Supplier Part Number 1: C338159; Tolerance: ±10%; Voltage Rating: 50V; Temperature Coefficient: X7R; RoHS: Yes; ComponentLink1Description: Datasheet; ComponentLink1URL: https://wmsc.lcsc.com/wmsc/upload/file/pdf/v2/lcsc/1912111437_Walsin-Tech-Corp-MT21B104K500CT_C338159.pdf; ComponentLink2Description: JLCPCB Part URL; ComponentLink2URL: https://jlcpcb.com/partdetail/C338159; ComponentLink3Description: LCSC Part URL; ComponentLink3URL: https://lcsc.com/product-detail/Multilayer-Ceramic-Capacitors-MLCC---SMD-SMT_Walsin-Tech-Corp-Walsin-Tech-Corp-MT21B104K500CT_C338159.html
footprint CAP-0805 (0805 (2012M) Capacitor)
pins: 1, 2

## MT21B224K500CT
designator C?  Capacitance: 220nF  (hidden comment: *)
Capacitor, Ceramic (MLCC), 220nF, ±10%, 50V, X7R, ±10%, SMD 0805; Manufacturer: Walsin Tech Corp; Manufacturer Part Number: MT21B224K500CT; Package Size: 0805; JLCPCB Basic Part: No; JLCPCB Part Number: C304428; Supplier 1: LCSC; Category: Capacitors - MLCC; Supplier Part Number 1: C304428; Tolerance: ±10%; Voltage Rating: 50V; Temperature Coefficient: X7R; RoHS: Yes; ComponentLink1Description: Datasheet; ComponentLink1URL: https://wmsc.lcsc.com/wmsc/upload/file/pdf/v2/lcsc/2304140030_Walsin-Tech-Corp-MT21B224K500CT_C304428.pdf; ComponentLink2Description: JLCPCB Part URL; ComponentLink2URL: https://jlcpcb.com/partdetail/C304428; ComponentLink3Description: LCSC Part URL; ComponentLink3URL: https://lcsc.com/product-detail/Multilayer-Ceramic-Capacitors-MLCC---SMD-SMT_Walsin-Tech-Corp-Walsin-Tech-Corp-MT21B224K500CT_C304428.html
footprint CAP-0805 (0805 (2012M) Capacitor)
pins: 1, 2

## MT21B333K101CT
designator C?  Capacitance: 33nF  (hidden comment: *)
Capacitor, Ceramic (MLCC), 33nF, ±10%, 100V, X7R, ±10%, SMD 0805; Manufacturer: Walsin Tech Corp; Manufacturer Part Number: MT21B333K101CT; Package Size: 0805; JLCPCB Basic Part: No; JLCPCB Part Number: C304429; Supplier 1: LCSC; Category: Capacitors - MLCC; Supplier Part Number 1: C304429; Tolerance: ±10%; Voltage Rating: 100V; Temperature Coefficient: X7R; RoHS: Yes; ComponentLink1Description: Datasheet; ComponentLink1URL: https://wmsc.lcsc.com/wmsc/upload/file/pdf/v2/lcsc/2304140030_Walsin-Tech-Corp-MT21B333K101CT_C304429.pdf; ComponentLink2Description: JLCPCB Part URL; ComponentLink2URL: https://jlcpcb.com/partdetail/C304429; ComponentLink3Description: LCSC Part URL; ComponentLink3URL: https://lcsc.com/product-detail/Multilayer-Ceramic-Capacitors-MLCC---SMD-SMT_Walsin-Tech-Corp-Walsin-Tech-Corp-MT21B333K101CT_C304429.html
footprint CAP-0805 (0805 (2012M) Capacitor)
pins: 1, 2

## MT21N470J101CT
designator C?  Capacitance: 47pF  (hidden comment: *)
Capacitor, Ceramic (MLCC), 47pF, ±5%, NP0, ±5%, SMD 0805; Manufacturer: Walsin Tech Corp; Manufacturer Part Number: MT21N470J101CT; Package Size: 0805; JLCPCB Basic Part: No; JLCPCB Part Number: C5139605; Supplier 1: LCSC; Category: Capacitors - MLCC; Supplier Part Number 1: C5139605; Tolerance: ±5%; Temperature Coefficient: NP0; RoHS: Yes; ComponentLink1Description: Datasheet; ComponentLink1URL: https://wmsc.lcsc.com/wmsc/upload/file/pdf/v2/lcsc/2208260930_Walsin-Tech-Corp-MT21N470J101CT_C5139605.pdf; ComponentLink2Description: JLCPCB Part URL; ComponentLink2URL: https://jlcpcb.com/partdetail/C5139605; ComponentLink3Description: LCSC Part URL; ComponentLink3URL: https://lcsc.com/product-detail/Multilayer-Ceramic-Capacitors-MLCC---SMD-SMT_Walsin-Tech-Corp-Walsin-Tech-Corp-MT21N470J101CT_C5139605.html
footprint CAP-0805 (0805 (2012M) Capacitor)
pins: 1, 2

## NC0805B105K101CEDN
designator C?  Capacitance: 1uF  (hidden comment: *)
Capacitor, Ceramic (MLCC), 1uF, ±10%, 100V, X7R, ±10%, SMD 0805; Manufacturer: HUI JU; Manufacturer Part Number: NC0805B105K101CEDN; Package Size: 0805; JLCPCB Basic Part: No; JLCPCB Part Number: C2940896; Supplier 1: LCSC; Category: Capacitors - MLCC; Supplier Part Number 1: C2940896; Tolerance: ±10%; Voltage Rating: 100V; Temperature Coefficient: X7R; RoHS: Yes; ComponentLink1Description: Datasheet; ComponentLink1URL: https://wmsc.lcsc.com/wmsc/upload/file/pdf/v2/lcsc/2201121900_HUI-JU-NC0805B105K101CEDN_C2940896.pdf; ComponentLink2Description: JLCPCB Part URL; ComponentLink2URL: https://jlcpcb.com/partdetail/C2940896; ComponentLink3Description: LCSC Part URL; ComponentLink3URL: https://lcsc.com/product-detail/Multilayer-Ceramic-Capacitors-MLCC---SMD-SMT_HUI-JU-HUI-JU-NC0805B105K101CEDN_C2940896.html
footprint CAP-0805 (0805 (2012M) Capacitor)
pins: 1, 2

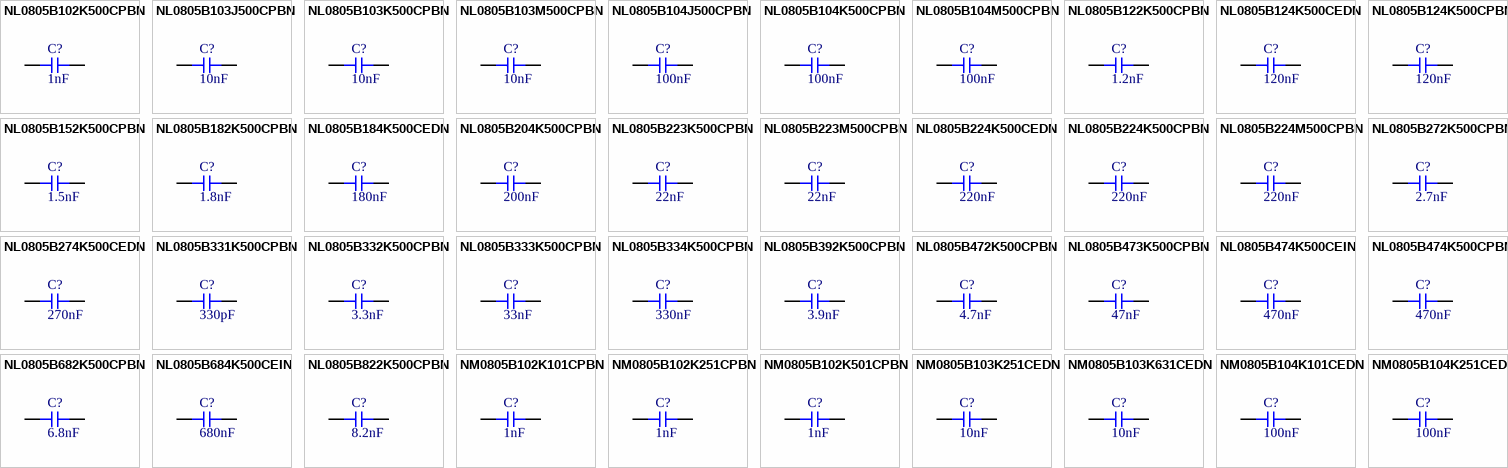
[diagram p72: symbols NL0805B102K500CPBN to NM0805B104K251CEDN]

## NL0805B102K500CPBN
designator C?  Capacitance: 1nF  (hidden comment: *)
Capacitor, Ceramic (MLCC), 1nF, ±10%, 50V, X7R, ±10%, SMD 0805; Manufacturer: HUI JU; Manufacturer Part Number: NL0805B102K500CPBN; Package Size: 0805; JLCPCB Basic Part: No; JLCPCB Part Number: C717019; Supplier 1: LCSC; Category: Capacitors - MLCC; Supplier Part Number 1: C717019; Tolerance: ±10%; Voltage Rating: 50V; Temperature Coefficient: X7R; RoHS: Yes; ComponentLink1Description: Datasheet; ComponentLink1URL: https://wmsc.lcsc.com/wmsc/upload/file/pdf/v2/lcsc/2304140030_HUI-JU-NL0805B102K500CPBN_C717019.pdf; ComponentLink2Description: JLCPCB Part URL; ComponentLink2URL: https://jlcpcb.com/partdetail/C717019; ComponentLink3Description: LCSC Part URL; ComponentLink3URL: https://lcsc.com/product-detail/Multilayer-Ceramic-Capacitors-MLCC---SMD-SMT_HUI-JU-HUI-JU-NL0805B102K500CPBN_C717019.html
footprint CAP-0805 (0805 (2012M) Capacitor)
pins: 1, 2

## NL0805B103J500CPBN
designator C?  Capacitance: 10nF  (hidden comment: *)
Capacitor, Ceramic (MLCC), 10nF, ±5%, 50V, ±5%, SMD 0805; Manufacturer: HUI JU; Manufacturer Part Number: NL0805B103J500CPBN; Package Size: 0805; JLCPCB Basic Part: No; JLCPCB Part Number: C841540; Supplier 1: LCSC; Category: Capacitors - MLCC; Supplier Part Number 1: C841540; Tolerance: ±5%; Voltage Rating: 50V; RoHS: Yes; ComponentLink1Description: Datasheet; ComponentLink1URL: https://wmsc.lcsc.com/wmsc/upload/file/pdf/v2/lcsc/2304140030_HUI-JU-NL0805B103J500CPBN_C841540.pdf; ComponentLink2Description: JLCPCB Part URL; ComponentLink2URL: https://jlcpcb.com/partdetail/C841540; ComponentLink3Description: LCSC Part URL; ComponentLink3URL: https://lcsc.com/product-detail/Multilayer-Ceramic-Capacitors-MLCC---SMD-SMT_HUI-JU-HUI-JU-NL0805B103J500CPBN_C841540.html
footprint CAP-0805 (0805 (2012M) Capacitor)
pins: 1, 2

## NL0805B103K500CPBN
designator C?  Capacitance: 10nF  (hidden comment: *)
Capacitor, Ceramic (MLCC), 10nF, ±10%, 50V, X7R, ±10%, SMD 0805; Manufacturer: HUI JU; Manufacturer Part Number: NL0805B103K500CPBN; Package Size: 0805; JLCPCB Basic Part: No; JLCPCB Part Number: C780691; Supplier 1: LCSC; Category: Capacitors - MLCC; Supplier Part Number 1: C780691; Tolerance: ±10%; Voltage Rating: 50V; Temperature Coefficient: X7R; RoHS: Yes; ComponentLink1Description: Datasheet; ComponentLink1URL: https://wmsc.lcsc.com/wmsc/upload/file/pdf/v2/lcsc/2304140030_HUI-JU-NL0805B103K500CPBN_C780691.pdf; ComponentLink2Description: JLCPCB Part URL; ComponentLink2URL: https://jlcpcb.com/partdetail/C780691; ComponentLink3Description: LCSC Part URL; ComponentLink3URL: https://lcsc.com/product-detail/Multilayer-Ceramic-Capacitors-MLCC---SMD-SMT_HUI-JU-HUI-JU-NL0805B103K500CPBN_C780691.html
footprint CAP-0805 (0805 (2012M) Capacitor)
pins: 1, 2

## NL0805B103M500CPBN
designator C?  Capacitance: 10nF  (hidden comment: *)
Capacitor, Ceramic (MLCC), 10nF, ±20%, 50V, ±20%, SMD 0805; Manufacturer: HUI JU; Manufacturer Part Number: NL0805B103M500CPBN; Package Size: 0805; JLCPCB Basic Part: No; JLCPCB Part Number: C883445; Supplier 1: LCSC; Category: Capacitors - MLCC; Supplier Part Number 1: C883445; Tolerance: ±20%; Voltage Rating: 50V; RoHS: Yes; ComponentLink1Description: Datasheet; ComponentLink1URL: https://wmsc.lcsc.com/wmsc/upload/file/pdf/v2/lcsc/2304140030_HUI-JU-NL0805B103M500CPBN_C883445.pdf; ComponentLink2Description: JLCPCB Part URL; ComponentLink2URL: https://jlcpcb.com/partdetail/C883445; ComponentLink3Description: LCSC Part URL; ComponentLink3URL: https://lcsc.com/product-detail/Multilayer-Ceramic-Capacitors-MLCC---SMD-SMT_HUI-JU-HUI-JU-NL0805B103M500CPBN_C883445.html
footprint CAP-0805 (0805 (2012M) Capacitor)
pins: 1, 2

## NL0805B104J500CPBN
designator C?  Capacitance: 100nF  (hidden comment: *)
Capacitor, Ceramic (MLCC), 100nF, ±5%, 50V, X7R, ±5%, SMD 0805; Manufacturer: HUI JU; Manufacturer Part Number: NL0805B104J500CPBN; Package Size: 0805; JLCPCB Basic Part: No; JLCPCB Part Number: C840115; Supplier 1: LCSC; Category: Capacitors - MLCC; Supplier Part Number 1: C840115; Tolerance: ±5%; Voltage Rating: 50V; Temperature Coefficient: X7R; RoHS: Yes; ComponentLink1Description: Datasheet; ComponentLink1URL: https://wmsc.lcsc.com/wmsc/upload/file/pdf/v2/lcsc/2304140030_HUI-JU-NL0805B104J500CPBN_C840115.pdf; ComponentLink2Description: JLCPCB Part URL; ComponentLink2URL: https://jlcpcb.com/partdetail/C840115; ComponentLink3Description: LCSC Part URL; ComponentLink3URL: https://lcsc.com/product-detail/Multilayer-Ceramic-Capacitors-MLCC---SMD-SMT_HUI-JU-HUI-JU-NL0805B104J500CPBN_C840115.html
footprint CAP-0805 (0805 (2012M) Capacitor)
pins: 1, 2

## NL0805B104K500CPBN
designator C?  Capacitance: 100nF  (hidden comment: *)
Capacitor, Ceramic (MLCC), 100nF, ±10%, 50V, X7R, ±10%, SMD 0805; Manufacturer: HUI JU; Manufacturer Part Number: NL0805B104K500CPBN; Package Size: 0805; JLCPCB Basic Part: No; JLCPCB Part Number: C710459; Supplier 1: LCSC; Category: Capacitors - MLCC; Supplier Part Number 1: C710459; Tolerance: ±10%; Voltage Rating: 50V; Temperature Coefficient: X7R; RoHS: Yes; ComponentLink1Description: Datasheet; ComponentLink1URL: https://wmsc.lcsc.com/wmsc/upload/file/pdf/v2/lcsc/2304140030_HUI-JU-NL0805B104K500CPBN_C710459.pdf; ComponentLink2Description: JLCPCB Part URL; ComponentLink2URL: https://jlcpcb.com/partdetail/C710459; ComponentLink3Description: LCSC Part URL; ComponentLink3URL: https://lcsc.com/product-detail/Multilayer-Ceramic-Capacitors-MLCC---SMD-SMT_HUI-JU-HUI-JU-NL0805B104K500CPBN_C710459.html
footprint CAP-0805 (0805 (2012M) Capacitor)
pins: 1, 2
